# Altium footprint library heromap.PcbLib: 593 footprints (part 37 of 38)
Each footprint in its own frame and in the unit in brackets; x right, y up, seen from the top. Pads: shape width x height; smd on the part's side, far side on the other; paste and mask are expansions set on the pad; w line width, h text height; cw(c..) or ccw(c..) is an arc to the next point about the centre after c.
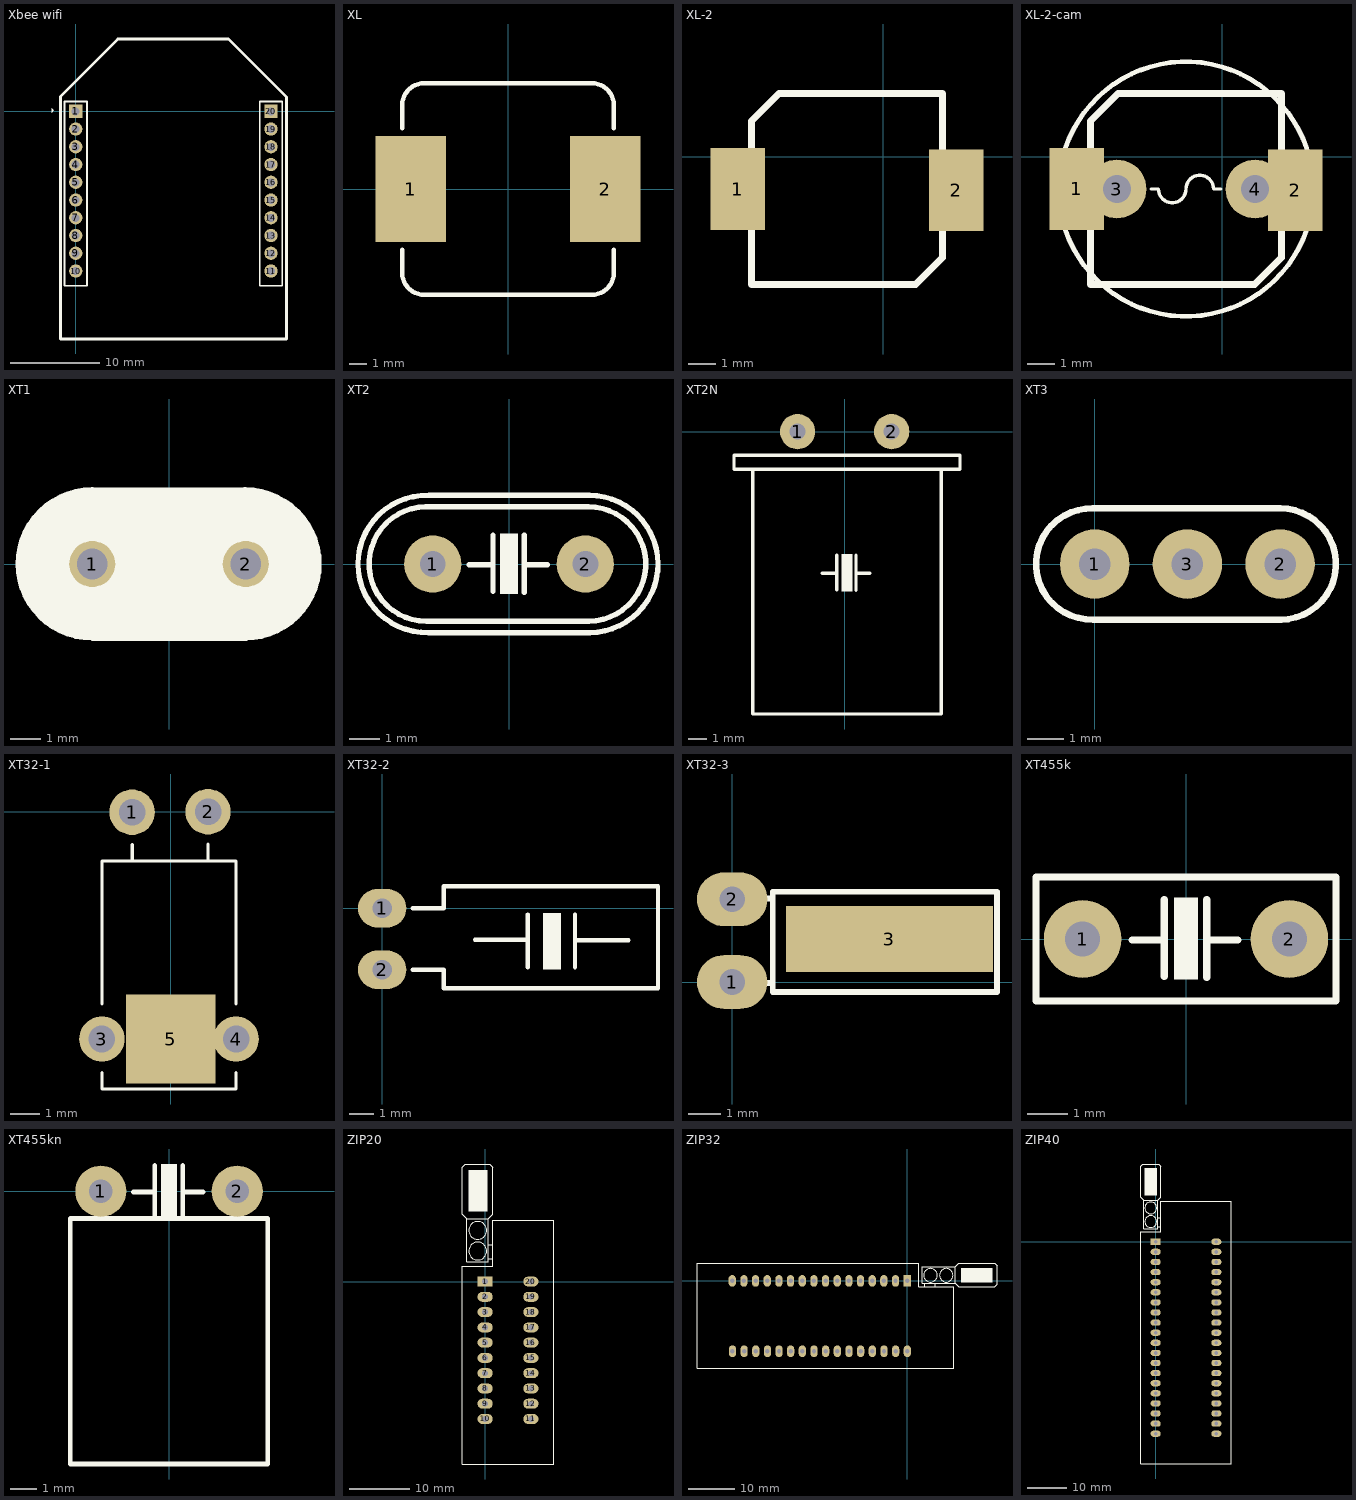
[diagram p36: the footprints below, top view; thin cyan lines are the x and y axes]

## Xbee wifi [mm] "Connector; Header; 10 Position"
pads (20):
  rect 1.5x1.5 hole 0.9: 1(0,0) 20(22,0)
  round 1.5 hole 0.9: 2(0,-2) 3(0,-4) 4(0,-6) 5(0,-8) 6(0,-10) 7(0,-12) 8(0,-14) 9(0,-16) 10(0,-18) 11(22,-18) 12(22,-16) 13(22,-14) 14(22,-12) 15(22,-10) 16(22,-8) 17(22,-6) 18(22,-4) 19(22,-2)
Top Overlay:
  region: -2.73,-0.14 -2.73,0.368 -2.451,0.14
  lines w0.2: -1.27,-19.67 1.27,-19.67 1.27,-0.635 1.27,1.12 -1.27,1.12 -1.27,-19.67 ; 20.73,-19.67 20.73,1.12 23.27,1.12 23.27,-0.635 23.27,-19.67 20.73,-19.67
  lines w0.3: -1.726,-25.659 -1.726,1.672 4.751,8.149 17.197,8.149 23.75,1.596 23.75,-25.659 -1.726,-25.659
3D body: height 5, standoff 4, extent -1.726,-25.659 23.75,8.306
3D body: height 4, standoff 2.5, extent 1.6,-19.787 20.472,1.118
3D body: height 4, standoff 1, extent -1.27,-19.67 1.27,1.12
3D body: height 4, standoff 1, extent 20.73,-19.67 23.27,1.12

## XL [mm]
pads (2):
  rect 4x6 smd: 1(-5.5,0) 2(5.5,0)
Top Overlay:
  lines w0.254: -6,-3.429 -6,-4.73 ccw(c-4.73,-4.73) -4.73,-6 4.73,-6 ccw(c4.73,-4.73) 6,-4.73 6,-3.429 ; -6,3.429 -6,4.73 cw(c-4.73,4.73) -4.73,6 4.73,6 cw(c4.73,4.73) 6,4.73 6,3.429
3D body: height 4, standoff 0, extent -6.299,-2.997 -5.791,2.997
3D body: height 4, standoff 0, extent 5.791,-2.997 6.299,2.997
3D body: height 8, standoff 0, extent -5.994,-6.02 6.02,5.994

## XL-2 [mm]
pads (2):
  rect 2x3 smd: 1(-5.351,-1.181) 2(2.684,-1.219)
Top Overlay:
  lines w0.254: -4.851,-4.699 -4.851,1.321 -3.835,2.337 2.184,2.337 2.184,-3.708 1.194,-4.699 -4.851,-4.699
3D body: height 2, standoff 0, extent 2.159,-2.553 2.438,0.14
3D body: height 2, standoff 0, extent -5.105,-2.515 -4.826,0.178
3D body: height 3.2, standoff 0, extent -4.851,-4.699 2.184,2.337

## XL-2-cam [mil]
pads (4):
  rect 78.74x118.11 smd: 1(-210.67,-46.5) 2(105.67,-48)
  round 85 hole 40: 3(-152.5,-46.5) 4(47.5,-46.5)
Top Overlay:
  circle w7: c-52.5,-46.5 r184.39
  lines w5: -102.5,-46.5 -92.5,-46.5 ccw(c-72.5,-46.5) -52.5,-46.5 cw(c-32.5,-46.5) -12.5,-46.5 -2.5,-46.5
  lines w10: -191,-185 47,-185 86,-146 86,92 -151,92 -191,52 -191,-185
3D body: height 125.98, standoff 0, extent -191,-185 86,92
3D body: height 78.74, standoff 0, extent -201,-99 -190,7
3D body: height 78.74, standoff 0, extent 85,-100.5 96,5.5

## XT1 [mil]
pads (2):
  round 60 hole 40: 1(-100,0) 2(100,0)
Top Overlay:
  region: -100,95.57 -118.62,93.74 -136.53,88.3 -153.03,79.48 -167.5,67.61 -179.37,53.15 -188.19,36.64 -193.63,18.73 -195.46,0.11 -195,0.11 -195.46,0 -193.63,-18.6 -188.2,-36.49 -179.39,-52.97 -167.53,-67.42 -153.08,-79.28 -136.6,-88.09 -118.71,-93.52 -100.11,-95.35 -100.11,-94.89 99.78,-94.87 99.95,-94.94 100.02,-95.11 100,-95.57 118.62,-93.74 136.53,-88.3 153.03,-79.48 167.5,-67.61 179.37,-53.15 188.19,-36.64 193.63,-18.73 195.46,-0.11 195,-0.11 195.46,0 193.63,18.6 188.2,36.49 179.39,52.97 167.53,67.42 153.08,79.28 136.6,88.09 118.71,93.52 100.11,95.35 100.11,94.89 100,94.89
  lines w10: -100,-94.89 cw(c-100,0.11) -100,95.11 ; -99,-95.11 100,-95.11 ; -99,94.89 100,94.89 ; 99,-94.89 ccw(c99,0.11) 99,95.11
3D body: height 118.11, standoff 27.56, extent -164.02,-65.13 165.02,64.91
3D body: height 31.5, standoff 19.68, extent -174.02,-75.13 175.02,74.91
3D body: height 19.68, standoff -19.68, extent -119.98,-19.98 -80.02,19.98
3D body: height 19.68, standoff -19.68, extent 80.02,-19.98 119.98,19.98

## XT2 [mil] "Footpin for Crystal 2 pin"
pads (2):
  round 75 hole 34: 1(-100,0) 2(100,0)
Top Overlay:
  region: 11.5,40 11.5,-39 -11.5,-39 -11.5,40
  lines w7: -109,75 ccw(c-108.5,0) -108.27,-75 ; -106.97,-75 103.03,-75 ; -105.97,75 104.03,75 ; -105.02,-90 105.91,-90 ccw(c105.31,0) 105.03,90 -104.97,90.01 ccw(c-108,0.06) -105.02,-89.89 ; -52,-1 -21,-1 ; -21,-36 -21,38 ; 20,-37 20,38 ; 20,-1 50,-1 ; 104,75 cw(c104.23,0) 104.73,-75
3D body "SW3dPS-HP49US.STEP": height 137.8, standoff -157.48, extent -233.43,-93.07 213.43,90

## XT2N [mil] "Crystal 2pin, high 200 mil"
height 200
pads (2):
  round 75 hole 34: 1(-100,0) 2(100,0)
Top Overlay:
  region: 16.5,-260 16.5,-339 -6.5,-339 -6.5,-260
  lines w7: -48,-301 -17,-301 ; -17,-336 -17,-262 ; 24,-337 24,-262 ; 24,-301 54,-301 ; -235,-80 -195,-80 ; -235,-80 -235,-50 ; -235,-80 -195,-80 ; -235,-80 -235,-50 ; -235,-50 245,-50 ; -235,-50 245,-50 ; -195,-600 -195,-80 ; -195,-600 205,-600 ; -195,-600 -195,-80 ; -195,-600 205,-600 ; -195,-80 205,-80 ; -195,-80 205,-80 ; 205,-600 205,-80 ; 205,-600 205,-80 ; 205,-80 245,-80 ; 205,-80 245,-80 ; 245,-80 245,-50 ; 245,-80 245,-50
3D body "SW3dPS-HC49U.STEP": height 91.44, standoff -92.52, extent -209.86,-594.33 230,14.33

## XT3 [mil] "Crystal 3pin, High 200mil, Cremic"
height 200
pads (3):
  round 75 hole 34: 1(0,0) 2(200,0) 3(100,0)
Top Overlay:
  lines w7: -2,60 198,60 ; -1.38,-59.91 cw(c-3.36,0.06) -1.35,60.02 ; 1,-60 201,-60 ; 200.13,60 cw(c200.31,0) 200.71,-60

## XT32-1 [mil] "Cryxtal 32.768kHz"
pads (5):
  round 60 hole 35: 1(-51.15,-0.65) 2(49,0) 3(-91,-300) 4(86,-300)
  rect 118.11x118.11 smd: 5(0,-300)
Top Overlay:
  lines w4: -91,-344 -91,-366 86,-366 86,-344 ; -91,-254 -91,-65 86,-65 86,-254 ; -51,-65 -51,-43 ; 49,-65 49,-43 ; 49.15,-64.35 49.15,-42.35
3D body: height 129.78, standoff -11.67, extent -70.76,-352.98 70.42,-57.7
3D body: height 68.88, standoff 49.23, extent -60.96,-59.7 -41.35,-0.65
3D body: height 68.9, standoff 49.21, extent -60.87,-9.87 -41.29,9.73
3D body: height 59.06, standoff 0, extent -60.87,-9.87 -41.23,9.73
3D body: height 59.06, standoff 0, extent 39.28,-9.22 58.93,10.38
3D body: height 68.9, standoff 49.21, extent 39.28,-9.22 58.86,10.38
3D body: height 68.88, standoff 49.23, extent 39.2,-59.06 58.8,0

## XT32-2 [mm] "Crystal 32k, 2 pin, real timer for DS1307"
height 3.81
pads (2):
  oval 2x1.6 hole 0.813: 1(0,0) 2(0,-2.54)
Top Overlay:
  rectangle: 6.655,-2.54 7.391,-0.203
  lines w0.178: 1.27,-2.54 2.54,-2.54 2.54,-3.302 11.405,-3.302 11.405,0.914 2.54,0.914 2.54,0 1.27,0 ; 3.835,-1.295 6.02,-1.295 ; 6.02,-2.438 6.02,-0.254 ; 7.976,-2.438 7.976,-0.254 ; 8.001,-1.321 10.185,-1.321
3D body "User Library-Crystal TH.STEP": height 3.4, standoff 0.2, extent 0.15,-2.866 10.925,0.584

## XT32-3 [mil] "Crystal for 32,768kHz, 2pin"
height 150
pads (3):
  oval 85x65 hole 31: 1(0,0) 2(0,100)
  rect 250x80 smd: 3(190,52)
Top Overlay:
  lines w7: 34,-1 49,-1 ; 35,101 49,101 ; 49,101 49,109 320,109 320,-12 49,-12 49,101
3D body: height 68.88, standoff 49.23, extent 0,90.2 59.06,109.8
3D body: height 68.9, standoff 49.21, extent -10.38,90.28 9.22,109.86
3D body: height 59.06, standoff 0, extent -10.38,90.28 9.22,109.93
3D body: height 59.06, standoff 0, extent -9.73,-9.87 9.87,9.77
3D body: height 68.9, standoff 49.21, extent -9.73,-9.87 9.87,9.71
3D body: height 68.88, standoff 49.23, extent 0.65,-9.96 59.7,9.65
3D body: height 129.78, standoff -11.67, extent 57.7,-19.76 352.98,121.42

## XT455k [mil] "Thach anh 455khz (Infrared)"
pads (2):
  round 75 hole 34: 1(-100,0) 2(100,0)
Top Overlay:
  region: 11.5,40 11.5,-39 -11.5,-39 -11.5,40
  lines w7: -52,-1 -21,-1 ; -21,-36 -21,38 ; 20,-37 20,38 ; 20,-1 50,-1 ; -145,-60 145,-60 145,60 -145,60 -145,-60

## XT455kn [mil] "Thach anh 455khz (Infrared)"
pads (2):
  round 75 hole 34: 1(-100,0) 2(100,0)
Top Overlay:
  region: 11.5,40 11.5,-39 -11.5,-39 -11.5,40
  lines w7: -52,-1 -21,-1 ; -21,-36 -21,38 ; 20,-37 20,38 ; 20,-1 50,-1 ; -145,-400 -145,-40 145,-40 145,-400 -145,-400

## ZIP20 [mil] "DIP 20, W 600mil/ L 1600mil"
height 300
pads (20):
  rect 100x65 hole 38: 1(0,0)
  oval 100x65 hole 38: 2(0,-100) 3(0,-200) 4(0,-300) 5(0,-400) 6(0,-500) 7(0,-600) 8(0,-700) 9(0,-800) 10(0,-900) 11(300,-900) 12(300,-800) 13(300,-700) 14(300,-600) 15(300,-500) 16(300,-400) 17(300,-300) 18(300,-200) 19(300,-100) 20(300,0)
Top Overlay:
  circle w7: c-48.31,200 r58.31
  circle w7: c-48.31,335 r58.31
  rectangle: -110,460 15,730
  lines w7: 20,150 50,150 ; 20,240 50,240 ; -120,410 20,410 ; -120,410 -150,440 -150,750 -130,770 30,770 50,750 50,440 20,410 ; -120,410 -120,130 -110,130 20,130 20,410 ; -150,-1195 450,-1195 450,400 50,400 50,100 -150,100 -150,-1195

## ZIP32 [mil] "32 PIN, W 900 mil , L 2200 mil , Push Pro FOR Chip"
height 300
pads (32):
  rect 62x100 hole 38: 1(0,0)
  oval 62x100 hole 38: 2(-100,0) 3(-200,0) 4(-300,0) 5(-400,0) 6(-500,0) 7(-600,0) 8(-700,0) 9(-800,0) 10(-900,0) 11(-1000,0) 12(-1100,0) 13(-1200,0) 14(-1300,0) 15(-1400,0) 16(-1500,0) 17(-1498,-603) 18(-1398,-603) 19(-1298,-603) 20(-1198,-603) 21(-1099,-603) 22(-999,-603) 23(-899,-603) 24(-799,-603) 25(-699,-603) 26(-599,-603) 27(-499,-603) 28(-399,-603) 29(-299,-603) 30(-199,-603) 31(-99,-603) 32(1,-603)
Top Overlay:
  circle w7: c200,48.31 r58.31
  circle w7: c335,48.31 r58.31
  region: 460,110 460,-15 730,-15 730,110
  lines w7: 150,-50 150,-20 ; 240,-50 240,-20 ; 410,-20 410,120 ; 410,-20 130,-20 130,110 130,120 410,120 ; 410,-20 440,-50 750,-50 770,-30 770,130 750,150 440,150 410,120 ; -1802,-750 400,-750 400,-600 400,-50 100,-50 100,150 -1802,150 -1802,-750

## ZIP40 [mil] "40 PIN, W 900 mil , L 2600 mil , Push Pro FOR Chip"
height 300
pads (40):
  rect 100x62 hole 38: 1(0,0)
  oval 100x62 hole 38: 2(0,-100) 3(0,-200) 4(0,-300) 5(0,-400) 6(0,-500) 7(0,-600) 8(0,-700) 9(0,-800) 10(0,-900) 11(0,-1000) 12(0,-1100) 13(0,-1200) 14(0,-1300) 15(0,-1400) 16(0,-1500) 17(0,-1600) 18(0,-1700) 19(0,-1800) 20(0,-1900) 21(600,-1900) 22(600,-1800) 23(600,-1700) 24(600,-1600) 25(600,-1500) 26(600,-1400) 27(600,-1300) 28(600,-1200) 29(600,-1100) 30(600,-1000) 31(600,-900) 32(600,-800) 33(600,-700) 34(600,-600) 35(600,-500) 36(600,-400) 37(600,-300) 38(600,-200) 39(600,-100) 40(600,0)
Top Overlay:
  circle w7: c-48.31,200 r58.31
  circle w7: c-48.31,335 r58.31
  rectangle: -110,460 15,730
  lines w7: 20,150 50,150 ; 20,240 50,240 ; -120,410 20,410 ; -120,410 -150,440 -150,750 -130,770 30,770 50,750 50,440 20,410 ; -120,410 -120,130 -110,130 20,130 20,410 ; -150,-2200 750,-2200 750,400 600,400 50,400 50,100 -150,100 -150,-2200
3D body "SW3dPS-zif.STEP": height 443.07, standoff -186.85, extent -189.6,-2144.51 750,894.51